# Altium schematic symbol library jlcpcb_2025_04_resistors_extended_0201.schlib: 1508 symbols (part 7 of 8)
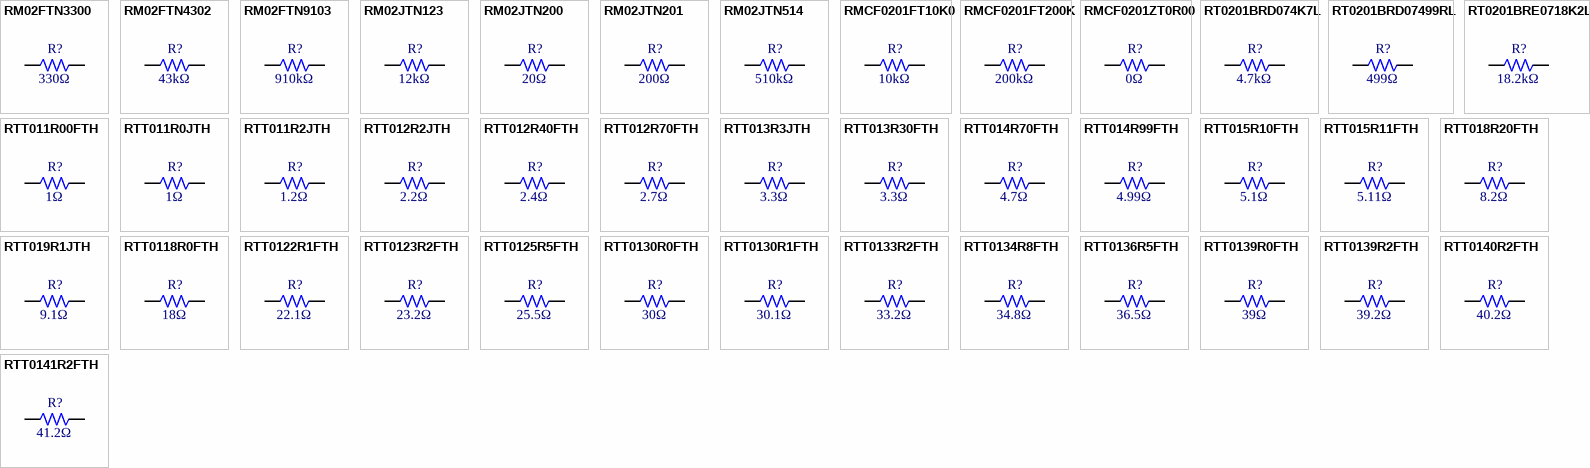
[diagram p43: symbols RM02FTN3300 to RTT0141R2FTH]

## RTT012R2JTH
designator R?  Resistance: 2.2Ω  (hidden comment: *)
Resistor, 2.2Ω, ±5%, 50mW, 25V, -200ppm/℃~+400ppm/℃, -55℃~+125℃, SMD 0201; Manufacturer: Uniroyal; Manufacturer Part Number: RTT012R2JTH; Supplier 1: LCSC; Supplier Part Number 1: C102714; JLCPCB Part Number: C102714; Power Rating: 50mW; Category: Resistors; Package Size: 0201; JLCPCB Basic Part: Yes; Tolerance: ±5%; Voltage Rating: 25V; Temperature Coefficient: -200ppm/℃~+400ppm/℃; Temperature Rating: -55℃~+125℃; ComponentLink1Description: Datasheet; ComponentLink1URL: https://wmsc.lcsc.com/wmsc/upload/file/pdf/v2/lcsc/2304140030_RALEC-RTT012R2JTH_C102714.pdf; ComponentLink2Description: JLCPCB Part URL; ComponentLink2URL: https://jlcpcb.com/partdetail/C102714
pins: 1, 2
1 alternate drawing of the same symbol

## RTT012R40FTH
designator R?  Resistance: 2.4Ω  (hidden comment: *)
Resistor, 2.4Ω, ±1%, 50mW, 25V, -200ppm/℃~+400ppm/℃, -55℃~+125℃, SMD 0201; Manufacturer: Uniroyal; Manufacturer Part Number: RTT012R40FTH; Supplier 1: LCSC; Supplier Part Number 1: C166072; JLCPCB Part Number: C166072; Power Rating: 50mW; Category: Resistors; Package Size: 0201; JLCPCB Basic Part: Yes; Tolerance: ±1%; Voltage Rating: 25V; Temperature Coefficient: -200ppm/℃~+400ppm/℃; Temperature Rating: -55℃~+125℃; ComponentLink1Description: Datasheet; ComponentLink1URL: https://wmsc.lcsc.com/wmsc/upload/file/pdf/v2/lcsc/2304140030_RALEC-RTT012R40FTH_C166072.pdf; ComponentLink2Description: JLCPCB Part URL; ComponentLink2URL: https://jlcpcb.com/partdetail/C166072
pins: 1, 2
1 alternate drawing of the same symbol

## RTT012R70FTH
designator R?  Resistance: 2.7Ω  (hidden comment: *)
Resistor, 2.7Ω, ±1%, 50mW, 25V, -200ppm/℃~+400ppm/℃, -55℃~+125℃, SMD 0201; Manufacturer: Uniroyal; Manufacturer Part Number: RTT012R70FTH; Supplier 1: LCSC; Supplier Part Number 1: C158629; JLCPCB Part Number: C158629; Power Rating: 50mW; Category: Resistors; Package Size: 0201; JLCPCB Basic Part: Yes; Tolerance: ±1%; Voltage Rating: 25V; Temperature Coefficient: -200ppm/℃~+400ppm/℃; Temperature Rating: -55℃~+125℃; ComponentLink1Description: Datasheet; ComponentLink1URL: https://wmsc.lcsc.com/wmsc/upload/file/pdf/v2/lcsc/2304140030_RALEC-RTT012R70FTH_C158629.pdf; ComponentLink2Description: JLCPCB Part URL; ComponentLink2URL: https://jlcpcb.com/partdetail/C158629
pins: 1, 2
1 alternate drawing of the same symbol

## RTT013R3JTH
designator R?  Resistance: 3.3Ω  (hidden comment: *)
Resistor, 3.3Ω, ±5%, 50mW, 25V, -200ppm/℃~+400ppm/℃, -55℃~+125℃, SMD 0201; Manufacturer: Uniroyal; Manufacturer Part Number: RTT013R3JTH; Supplier 1: LCSC; Supplier Part Number 1: C158545; JLCPCB Part Number: C158545; Power Rating: 50mW; Category: Resistors; Package Size: 0201; JLCPCB Basic Part: Yes; Tolerance: ±5%; Voltage Rating: 25V; Temperature Coefficient: -200ppm/℃~+400ppm/℃; Temperature Rating: -55℃~+125℃; ComponentLink1Description: Datasheet; ComponentLink1URL: https://wmsc.lcsc.com/wmsc/upload/file/pdf/v2/lcsc/2304140030_RALEC-RTT013R3JTH_C158545.pdf; ComponentLink2Description: JLCPCB Part URL; ComponentLink2URL: https://jlcpcb.com/partdetail/C158545
pins: 1, 2
1 alternate drawing of the same symbol

## RTT013R30FTH
designator R?  Resistance: 3.3Ω  (hidden comment: *)
Resistor, 3.3Ω, ±1%, 50mW, 25V, -200ppm/℃~+400ppm/℃, -55℃~+125℃, SMD 0201; Manufacturer: Uniroyal; Manufacturer Part Number: RTT013R30FTH; Supplier 1: LCSC; Supplier Part Number 1: C158547; JLCPCB Part Number: C158547; Power Rating: 50mW; Category: Resistors; Package Size: 0201; JLCPCB Basic Part: Yes; Tolerance: ±1%; Voltage Rating: 25V; Temperature Coefficient: -200ppm/℃~+400ppm/℃; Temperature Rating: -55℃~+125℃; ComponentLink1Description: Datasheet; ComponentLink1URL: https://wmsc.lcsc.com/wmsc/upload/file/pdf/v2/lcsc/2304140030_RALEC-RTT013R30FTH_C158547.pdf; ComponentLink2Description: JLCPCB Part URL; ComponentLink2URL: https://jlcpcb.com/partdetail/C158547
pins: 1, 2
1 alternate drawing of the same symbol

## RTT014R70FTH
designator R?  Resistance: 4.7Ω  (hidden comment: *)
Resistor, 4.7Ω, ±1%, 50mW, 25V, -200ppm/℃~+400ppm/℃, -55℃~+125℃, SMD 0201; Manufacturer: Uniroyal; Manufacturer Part Number: RTT014R70FTH; Supplier 1: LCSC; Supplier Part Number 1: C166070; JLCPCB Part Number: C166070; Power Rating: 50mW; Category: Resistors; Package Size: 0201; JLCPCB Basic Part: Yes; Tolerance: ±1%; Voltage Rating: 25V; Temperature Coefficient: -200ppm/℃~+400ppm/℃; Temperature Rating: -55℃~+125℃; ComponentLink1Description: Datasheet; ComponentLink1URL: https://wmsc.lcsc.com/wmsc/upload/file/pdf/v2/lcsc/2304140030_RALEC-RTT014R70FTH_C166070.pdf; ComponentLink2Description: JLCPCB Part URL; ComponentLink2URL: https://jlcpcb.com/partdetail/C166070
pins: 1, 2
1 alternate drawing of the same symbol

## RTT014R99FTH
designator R?  Resistance: 4.99Ω  (hidden comment: *)
Resistor, 4.99Ω, ±1%, 50mW, 25V, -200ppm/℃~+400ppm/℃, -55℃~+125℃, SMD 0201; Manufacturer: Uniroyal; Manufacturer Part Number: RTT014R99FTH; Supplier 1: LCSC; Supplier Part Number 1: C158479; JLCPCB Part Number: C158479; Power Rating: 50mW; Category: Resistors; Package Size: 0201; JLCPCB Basic Part: Yes; Tolerance: ±1%; Voltage Rating: 25V; Temperature Coefficient: -200ppm/℃~+400ppm/℃; Temperature Rating: -55℃~+125℃; ComponentLink1Description: Datasheet; ComponentLink1URL: https://wmsc.lcsc.com/wmsc/upload/file/pdf/v2/lcsc/2304140030_RALEC-RTT014R99FTH_C158479.pdf; ComponentLink2Description: JLCPCB Part URL; ComponentLink2URL: https://jlcpcb.com/partdetail/C158479
pins: 1, 2
1 alternate drawing of the same symbol

## RTT015R10FTH
designator R?  Resistance: 5.1Ω  (hidden comment: *)
Resistor, 5.1Ω, ±1%, 50mW, 25V, -200ppm/℃~+400ppm/℃, -55℃~+125℃, SMD 0201; Manufacturer: Uniroyal; Manufacturer Part Number: RTT015R10FTH; Supplier 1: LCSC; Supplier Part Number 1: C166069; JLCPCB Part Number: C166069; Power Rating: 50mW; Category: Resistors; Package Size: 0201; JLCPCB Basic Part: Yes; Tolerance: ±1%; Voltage Rating: 25V; Temperature Coefficient: -200ppm/℃~+400ppm/℃; Temperature Rating: -55℃~+125℃; ComponentLink1Description: Datasheet; ComponentLink1URL: https://wmsc.lcsc.com/wmsc/upload/file/pdf/v2/lcsc/2304140030_RALEC-RTT015R10FTH_C166069.pdf; ComponentLink2Description: JLCPCB Part URL; ComponentLink2URL: https://jlcpcb.com/partdetail/C166069
pins: 1, 2
1 alternate drawing of the same symbol

## RTT015R11FTH
designator R?  Resistance: 5.11Ω  (hidden comment: *)
Resistor, 5.11Ω, ±1%, 50mW, ±600ppm/℃, SMD 0201; Manufacturer: Uniroyal; Manufacturer Part Number: RTT015R11FTH; Supplier 1: LCSC; Supplier Part Number 1: C166068; JLCPCB Part Number: C166068; Power Rating: 50mW; Category: Resistors; Package Size: 0201; JLCPCB Basic Part: Yes; Tolerance: ±1%; Temperature Coefficient: ±600ppm/℃; ComponentLink1Description: Datasheet; ComponentLink1URL: https://wmsc.lcsc.com/wmsc/upload/file/pdf/v2/lcsc/2304140030_RALEC-RTT015R11FTH_C166068.pdf; ComponentLink2Description: JLCPCB Part URL; ComponentLink2URL: https://jlcpcb.com/partdetail/C166068
pins: 1, 2
1 alternate drawing of the same symbol

## RTT018R20FTH
designator R?  Resistance: 8.2Ω  (hidden comment: *)
Resistor, 8.2Ω, ±1%, 50mW, 25V, -200ppm/℃~+400ppm/℃, -55℃~+125℃, SMD 0201; Manufacturer: Uniroyal; Manufacturer Part Number: RTT018R20FTH; Supplier 1: LCSC; Supplier Part Number 1: C166065; JLCPCB Part Number: C166065; Power Rating: 50mW; Category: Resistors; Package Size: 0201; JLCPCB Basic Part: Yes; Tolerance: ±1%; Voltage Rating: 25V; Temperature Coefficient: -200ppm/℃~+400ppm/℃; Temperature Rating: -55℃~+125℃; ComponentLink1Description: Datasheet; ComponentLink1URL: https://wmsc.lcsc.com/wmsc/upload/file/pdf/v2/lcsc/2304140030_RALEC-RTT018R20FTH_C166065.pdf; ComponentLink2Description: JLCPCB Part URL; ComponentLink2URL: https://jlcpcb.com/partdetail/C166065
pins: 1, 2
1 alternate drawing of the same symbol

## RTT019R1JTH
designator R?  Resistance: 9.1Ω  (hidden comment: *)
Resistor, 9.1Ω, ±5%, 50mW, 25V, -200ppm/℃~+400ppm/℃, -55℃~+125℃, SMD 0201; Manufacturer: Uniroyal; Manufacturer Part Number: RTT019R1JTH; Supplier 1: LCSC; Supplier Part Number 1: C158291; JLCPCB Part Number: C158291; Power Rating: 50mW; Category: Resistors; Package Size: 0201; JLCPCB Basic Part: Yes; Tolerance: ±5%; Voltage Rating: 25V; Temperature Coefficient: -200ppm/℃~+400ppm/℃; Temperature Rating: -55℃~+125℃; ComponentLink1Description: Datasheet; ComponentLink1URL: https://wmsc.lcsc.com/wmsc/upload/file/pdf/v2/lcsc/2304140030_RALEC-RTT019R1JTH_C158291.pdf; ComponentLink2Description: JLCPCB Part URL; ComponentLink2URL: https://jlcpcb.com/partdetail/C158291
pins: 1, 2
1 alternate drawing of the same symbol

## RTT0118R0FTH
designator R?  Resistance: 18Ω  (hidden comment: *)
Resistor, 18Ω, ±1%, 50mW, 25V, ±200ppm/℃, -55℃~+125℃, SMD 0201; Manufacturer: Uniroyal; Manufacturer Part Number: RTT0118R0FTH; Supplier 1: LCSC; Supplier Part Number 1: C166312; JLCPCB Part Number: C166312; Power Rating: 50mW; Category: Resistors; Package Size: 0201; JLCPCB Basic Part: Yes; Tolerance: ±1%; Voltage Rating: 25V; Temperature Coefficient: ±200ppm/℃; Temperature Rating: -55℃~+125℃; ComponentLink1Description: Datasheet; ComponentLink1URL: https://wmsc.lcsc.com/wmsc/upload/file/pdf/v2/lcsc/2304140030_RALEC-RTT0118R0FTH_C166312.pdf; ComponentLink2Description: JLCPCB Part URL; ComponentLink2URL: https://jlcpcb.com/partdetail/C166312
pins: 1, 2
1 alternate drawing of the same symbol

## RTT0122R1FTH
designator R?  Resistance: 22.1Ω  (hidden comment: *)
Resistor, 22.1Ω, ±1%, 50mW, 25V, ±200ppm/℃, -55℃~+125℃, SMD 0201; Manufacturer: Uniroyal; Manufacturer Part Number: RTT0122R1FTH; Supplier 1: LCSC; Supplier Part Number 1: C166291; JLCPCB Part Number: C166291; Power Rating: 50mW; Category: Resistors; Package Size: 0201; JLCPCB Basic Part: Yes; Tolerance: ±1%; Voltage Rating: 25V; Temperature Coefficient: ±200ppm/℃; Temperature Rating: -55℃~+125℃; ComponentLink1Description: Datasheet; ComponentLink1URL: https://wmsc.lcsc.com/wmsc/upload/file/pdf/v2/lcsc/2304140030_RALEC-RTT0122R1FTH_C166291.pdf; ComponentLink2Description: JLCPCB Part URL; ComponentLink2URL: https://jlcpcb.com/partdetail/C166291
pins: 1, 2
1 alternate drawing of the same symbol

## RTT0123R2FTH
designator R?  Resistance: 23.2Ω  (hidden comment: *)
Resistor, 23.2Ω, ±1%, 50mW, 25V, ±200ppm/℃, -55℃~+125℃, SMD 0201; Manufacturer: Uniroyal; Manufacturer Part Number: RTT0123R2FTH; Supplier 1: LCSC; Supplier Part Number 1: C166283; JLCPCB Part Number: C166283; Power Rating: 50mW; Category: Resistors; Package Size: 0201; JLCPCB Basic Part: Yes; Tolerance: ±1%; Voltage Rating: 25V; Temperature Coefficient: ±200ppm/℃; Temperature Rating: -55℃~+125℃; ComponentLink1Description: Datasheet; ComponentLink1URL: https://wmsc.lcsc.com/wmsc/upload/file/pdf/v2/lcsc/2304140030_RALEC-RTT0123R2FTH_C166283.pdf; ComponentLink2Description: JLCPCB Part URL; ComponentLink2URL: https://jlcpcb.com/partdetail/C166283
pins: 1, 2
1 alternate drawing of the same symbol

## RTT0125R5FTH
designator R?  Resistance: 25.5Ω  (hidden comment: *)
Resistor, 25.5Ω, ±1%, 50mW, 25V, ±200ppm/℃, -55℃~+125℃, SMD 0201; Manufacturer: Uniroyal; Manufacturer Part Number: RTT0125R5FTH; Supplier 1: LCSC; Supplier Part Number 1: C166272; JLCPCB Part Number: C166272; Power Rating: 50mW; Category: Resistors; Package Size: 0201; JLCPCB Basic Part: Yes; Tolerance: ±1%; Voltage Rating: 25V; Temperature Coefficient: ±200ppm/℃; Temperature Rating: -55℃~+125℃; ComponentLink1Description: Datasheet; ComponentLink1URL: https://wmsc.lcsc.com/wmsc/upload/file/pdf/v2/lcsc/2304140030_RALEC-RTT0125R5FTH_C166272.pdf; ComponentLink2Description: JLCPCB Part URL; ComponentLink2URL: https://jlcpcb.com/partdetail/C166272
pins: 1, 2
1 alternate drawing of the same symbol

## RTT0130R0FTH
designator R?  Resistance: 30Ω  (hidden comment: *)
Resistor, 30Ω, ±1%, 50mW, 25V, ±200ppm/℃, -55℃~+125℃, SMD 0201; Manufacturer: Uniroyal; Manufacturer Part Number: RTT0130R0FTH; Supplier 1: LCSC; Supplier Part Number 1: C166248; JLCPCB Part Number: C166248; Power Rating: 50mW; Category: Resistors; Package Size: 0201; JLCPCB Basic Part: Yes; Tolerance: ±1%; Voltage Rating: 25V; Temperature Coefficient: ±200ppm/℃; Temperature Rating: -55℃~+125℃; ComponentLink1Description: Datasheet; ComponentLink1URL: https://wmsc.lcsc.com/wmsc/upload/file/pdf/v2/lcsc/2304140030_RALEC-RTT0130R0FTH_C166248.pdf; ComponentLink2Description: JLCPCB Part URL; ComponentLink2URL: https://jlcpcb.com/partdetail/C166248
pins: 1, 2
1 alternate drawing of the same symbol

## RTT0130R1FTH
designator R?  Resistance: 30.1Ω  (hidden comment: *)
Resistor, 30.1Ω, ±1%, 50mW, 25V, ±200ppm/℃, -55℃~+125℃, SMD 0201; Manufacturer: Uniroyal; Manufacturer Part Number: RTT0130R1FTH; Supplier 1: LCSC; Supplier Part Number 1: C166247; JLCPCB Part Number: C166247; Power Rating: 50mW; Category: Resistors; Package Size: 0201; JLCPCB Basic Part: Yes; Tolerance: ±1%; Voltage Rating: 25V; Temperature Coefficient: ±200ppm/℃; Temperature Rating: -55℃~+125℃; ComponentLink1Description: Datasheet; ComponentLink1URL: https://wmsc.lcsc.com/wmsc/upload/file/pdf/v2/lcsc/2304140030_RALEC-RTT0130R1FTH_C166247.pdf; ComponentLink2Description: JLCPCB Part URL; ComponentLink2URL: https://jlcpcb.com/partdetail/C166247
pins: 1, 2
1 alternate drawing of the same symbol

## RTT0133R2FTH
designator R?  Resistance: 33.2Ω  (hidden comment: *)
Resistor, 33.2Ω, ±1%, 50mW, 25V, ±200ppm/℃, -55℃~+125℃, SMD 0201; Manufacturer: Uniroyal; Manufacturer Part Number: RTT0133R2FTH; Supplier 1: LCSC; Supplier Part Number 1: C166232; JLCPCB Part Number: C166232; Power Rating: 50mW; Category: Resistors; Package Size: 0201; JLCPCB Basic Part: Yes; Tolerance: ±1%; Voltage Rating: 25V; Temperature Coefficient: ±200ppm/℃; Temperature Rating: -55℃~+125℃; ComponentLink1Description: Datasheet; ComponentLink1URL: https://wmsc.lcsc.com/wmsc/upload/file/pdf/v2/lcsc/2304140030_RALEC-RTT0133R2FTH_C166232.pdf; ComponentLink2Description: JLCPCB Part URL; ComponentLink2URL: https://jlcpcb.com/partdetail/C166232
pins: 1, 2
1 alternate drawing of the same symbol

## RTT0134R8FTH
designator R?  Resistance: 34.8Ω  (hidden comment: *)
Resistor, 34.8Ω, ±1%, 50mW, 25V, ±200ppm/℃, -55℃~+125℃, SMD 0201; Manufacturer: Uniroyal; Manufacturer Part Number: RTT0134R8FTH; Supplier 1: LCSC; Supplier Part Number 1: C166225; JLCPCB Part Number: C166225; Power Rating: 50mW; Category: Resistors; Package Size: 0201; JLCPCB Basic Part: Yes; Tolerance: ±1%; Voltage Rating: 25V; Temperature Coefficient: ±200ppm/℃; Temperature Rating: -55℃~+125℃; ComponentLink1Description: Datasheet; ComponentLink1URL: https://wmsc.lcsc.com/wmsc/upload/file/pdf/v2/lcsc/2304140030_RALEC-RTT0134R8FTH_C166225.pdf; ComponentLink2Description: JLCPCB Part URL; ComponentLink2URL: https://jlcpcb.com/partdetail/C166225
pins: 1, 2
1 alternate drawing of the same symbol

## RTT0136R5FTH
designator R?  Resistance: 36.5Ω  (hidden comment: *)
Resistor, 36.5Ω, ±1%, 50mW, 25V, ±200ppm/℃, -55℃~+125℃, SMD 0201; Manufacturer: Uniroyal; Manufacturer Part Number: RTT0136R5FTH; Supplier 1: LCSC; Supplier Part Number 1: C166217; JLCPCB Part Number: C166217; Power Rating: 50mW; Category: Resistors; Package Size: 0201; JLCPCB Basic Part: Yes; Tolerance: ±1%; Voltage Rating: 25V; Temperature Coefficient: ±200ppm/℃; Temperature Rating: -55℃~+125℃; ComponentLink1Description: Datasheet; ComponentLink1URL: https://wmsc.lcsc.com/wmsc/upload/file/pdf/v2/lcsc/2304140030_RALEC-RTT0136R5FTH_C166217.pdf; ComponentLink2Description: JLCPCB Part URL; ComponentLink2URL: https://jlcpcb.com/partdetail/C166217
pins: 1, 2
1 alternate drawing of the same symbol

## RTT0139R0FTH
designator R?  Resistance: 39Ω  (hidden comment: *)
Resistor, 39Ω, ±1%, 50mW, 25V, ±200ppm/℃, -55℃~+125℃, SMD 0201; Manufacturer: Uniroyal; Manufacturer Part Number: RTT0139R0FTH; Supplier 1: LCSC; Supplier Part Number 1: C166209; JLCPCB Part Number: C166209; Power Rating: 50mW; Category: Resistors; Package Size: 0201; JLCPCB Basic Part: Yes; Tolerance: ±1%; Voltage Rating: 25V; Temperature Coefficient: ±200ppm/℃; Temperature Rating: -55℃~+125℃; ComponentLink1Description: Datasheet; ComponentLink1URL: https://wmsc.lcsc.com/wmsc/upload/file/pdf/v2/lcsc/2304140030_RALEC-RTT0139R0FTH_C166209.pdf; ComponentLink2Description: JLCPCB Part URL; ComponentLink2URL: https://jlcpcb.com/partdetail/C166209
pins: 1, 2
1 alternate drawing of the same symbol

## RTT0139R2FTH
designator R?  Resistance: 39.2Ω  (hidden comment: *)
Resistor, 39.2Ω, ±1%, 50mW, 25V, ±200ppm/℃, -55℃~+125℃, SMD 0201; Manufacturer: Uniroyal; Manufacturer Part Number: RTT0139R2FTH; Supplier 1: LCSC; Supplier Part Number 1: C166208; JLCPCB Part Number: C166208; Power Rating: 50mW; Category: Resistors; Package Size: 0201; JLCPCB Basic Part: Yes; Tolerance: ±1%; Voltage Rating: 25V; Temperature Coefficient: ±200ppm/℃; Temperature Rating: -55℃~+125℃; ComponentLink1Description: Datasheet; ComponentLink1URL: https://wmsc.lcsc.com/wmsc/upload/file/pdf/v2/lcsc/2304140030_RALEC-RTT0139R2FTH_C166208.pdf; ComponentLink2Description: JLCPCB Part URL; ComponentLink2URL: https://jlcpcb.com/partdetail/C166208
pins: 1, 2
1 alternate drawing of the same symbol

## RTT0140R2FTH
designator R?  Resistance: 40.2Ω  (hidden comment: *)
Resistor, 40.2Ω, ±1%, 50mW, 25V, ±200ppm/℃, -55℃~+125℃, SMD 0201; Manufacturer: Uniroyal; Manufacturer Part Number: RTT0140R2FTH; Supplier 1: LCSC; Supplier Part Number 1: C166206; JLCPCB Part Number: C166206; Power Rating: 50mW; Category: Resistors; Package Size: 0201; JLCPCB Basic Part: Yes; Tolerance: ±1%; Voltage Rating: 25V; Temperature Coefficient: ±200ppm/℃; Temperature Rating: -55℃~+125℃; ComponentLink1Description: Datasheet; ComponentLink1URL: https://wmsc.lcsc.com/wmsc/upload/file/pdf/v2/lcsc/2304140030_RALEC-RTT0140R2FTH_C166206.pdf; ComponentLink2Description: JLCPCB Part URL; ComponentLink2URL: https://jlcpcb.com/partdetail/C166206
pins: 1, 2
1 alternate drawing of the same symbol

## RTT0141R2FTH
designator R?  Resistance: 41.2Ω  (hidden comment: *)
Resistor, 41.2Ω, ±1%, 50mW, 25V, ±200ppm/℃, -55℃~+125℃, SMD 0201; Manufacturer: Uniroyal; Manufacturer Part Number: RTT0141R2FTH; Supplier 1: LCSC; Supplier Part Number 1: C166203; JLCPCB Part Number: C166203; Power Rating: 50mW; Category: Resistors; Package Size: 0201; JLCPCB Basic Part: Yes; Tolerance: ±1%; Voltage Rating: 25V; Temperature Coefficient: ±200ppm/℃; Temperature Rating: -55℃~+125℃; ComponentLink1Description: Datasheet; ComponentLink1URL: https://wmsc.lcsc.com/wmsc/upload/file/pdf/v2/lcsc/2304140030_RALEC-RTT0141R2FTH_C166203.pdf; ComponentLink2Description: JLCPCB Part URL; ComponentLink2URL: https://jlcpcb.com/partdetail/C166203
pins: 1, 2
1 alternate drawing of the same symbol

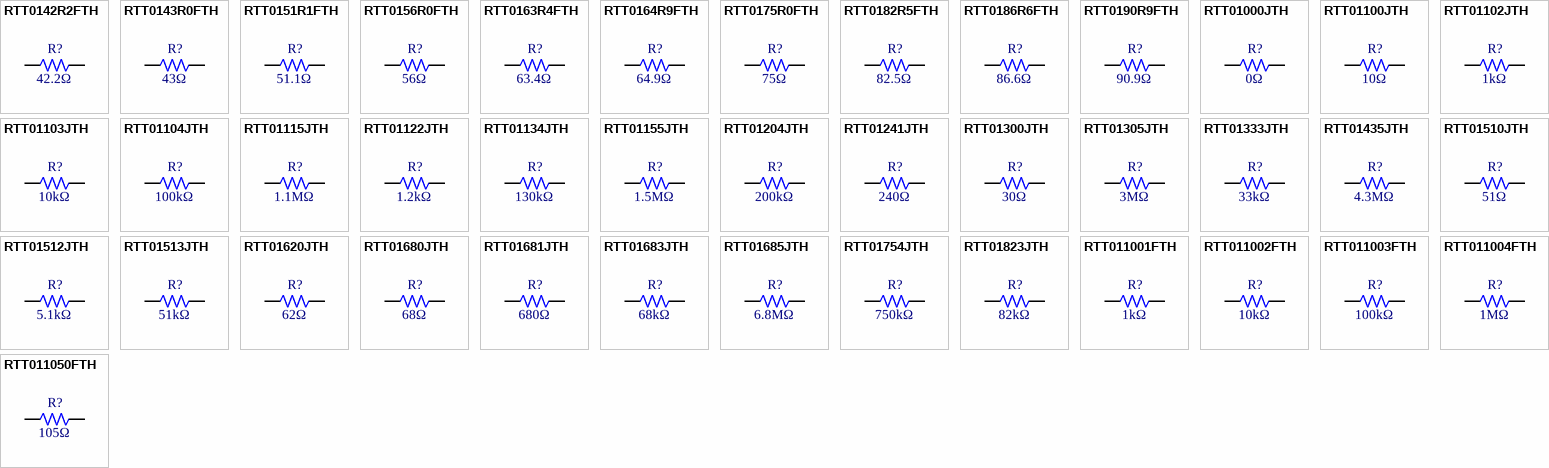
[diagram p30: symbols RTT0142R2FTH to RTT011050FTH]

## RTT0142R2FTH
designator R?  Resistance: 42.2Ω  (hidden comment: *)
Resistor, 42.2Ω, ±1%, 50mW, 25V, ±200ppm/℃, -55℃~+125℃, SMD 0201; Manufacturer: Uniroyal; Manufacturer Part Number: RTT0142R2FTH; Supplier 1: LCSC; Supplier Part Number 1: C166198; JLCPCB Part Number: C166198; Power Rating: 50mW; Category: Resistors; Package Size: 0201; JLCPCB Basic Part: Yes; Tolerance: ±1%; Voltage Rating: 25V; Temperature Coefficient: ±200ppm/℃; Temperature Rating: -55℃~+125℃; ComponentLink1Description: Datasheet; ComponentLink1URL: https://wmsc.lcsc.com/wmsc/upload/file/pdf/v2/lcsc/2304140030_RALEC-RTT0142R2FTH_C166198.pdf; ComponentLink2Description: JLCPCB Part URL; ComponentLink2URL: https://jlcpcb.com/partdetail/C166198
pins: 1, 2
1 alternate drawing of the same symbol

## RTT0143R0FTH
designator R?  Resistance: 43Ω  (hidden comment: *)
Resistor, 43Ω, ±1%, 50mW, ±200ppm/℃, SMD 0201; Manufacturer: Uniroyal; Manufacturer Part Number: RTT0143R0FTH; Supplier 1: LCSC; Supplier Part Number 1: C166193; JLCPCB Part Number: C166193; Power Rating: 50mW; Category: Resistors; Package Size: 0201; JLCPCB Basic Part: Yes; Tolerance: ±1%; Temperature Coefficient: ±200ppm/℃; ComponentLink1Description: Datasheet; ComponentLink1URL: https://wmsc.lcsc.com/wmsc/upload/file/pdf/v2/lcsc/2304140030_RALEC-RTT0143R0FTH_C166193.pdf; ComponentLink2Description: JLCPCB Part URL; ComponentLink2URL: https://jlcpcb.com/partdetail/C166193
pins: 1, 2
1 alternate drawing of the same symbol

## RTT0151R1FTH
designator R?  Resistance: 51.1Ω  (hidden comment: *)
Resistor, 51.1Ω, ±1%, 50mW, 25V, ±200ppm/℃, -55℃~+125℃, SMD 0201; Manufacturer: Uniroyal; Manufacturer Part Number: RTT0151R1FTH; Supplier 1: LCSC; Supplier Part Number 1: C166165; JLCPCB Part Number: C166165; Power Rating: 50mW; Category: Resistors; Package Size: 0201; JLCPCB Basic Part: Yes; Tolerance: ±1%; Voltage Rating: 25V; Temperature Coefficient: ±200ppm/℃; Temperature Rating: -55℃~+125℃; ComponentLink1Description: Datasheet; ComponentLink1URL: https://wmsc.lcsc.com/wmsc/upload/file/pdf/v2/lcsc/2304140030_RALEC-RTT0151R1FTH_C166165.pdf; ComponentLink2Description: JLCPCB Part URL; ComponentLink2URL: https://jlcpcb.com/partdetail/C166165
pins: 1, 2
1 alternate drawing of the same symbol

## RTT0156R0FTH
designator R?  Resistance: 56Ω  (hidden comment: *)
Resistor, 56Ω, ±1%, 50mW, 25V, ±200ppm/℃, -55℃~+125℃, SMD 0201; Manufacturer: Uniroyal; Manufacturer Part Number: RTT0156R0FTH; Supplier 1: LCSC; Supplier Part Number 1: C166149; JLCPCB Part Number: C166149; Power Rating: 50mW; Category: Resistors; Package Size: 0201; JLCPCB Basic Part: Yes; Tolerance: ±1%; Voltage Rating: 25V; Temperature Coefficient: ±200ppm/℃; Temperature Rating: -55℃~+125℃; ComponentLink1Description: Datasheet; ComponentLink1URL: https://wmsc.lcsc.com/wmsc/upload/file/pdf/v2/lcsc/2304140030_RALEC-RTT0156R0FTH_C166149.pdf; ComponentLink2Description: JLCPCB Part URL; ComponentLink2URL: https://jlcpcb.com/partdetail/C166149
pins: 1, 2
1 alternate drawing of the same symbol

## RTT0163R4FTH
designator R?  Resistance: 63.4Ω  (hidden comment: *)
Resistor, 63.4Ω, ±1%, 50mW, ±200ppm/℃, SMD 0201; Manufacturer: Uniroyal; Manufacturer Part Number: RTT0163R4FTH; Supplier 1: LCSC; Supplier Part Number 1: C166134; JLCPCB Part Number: C166134; Power Rating: 50mW; Category: Resistors; Package Size: 0201; JLCPCB Basic Part: Yes; Tolerance: ±1%; Temperature Coefficient: ±200ppm/℃; ComponentLink1Description: Datasheet; ComponentLink1URL: https://wmsc.lcsc.com/wmsc/upload/file/pdf/v2/lcsc/2304140030_RALEC-RTT0163R4FTH_C166134.pdf; ComponentLink2Description: JLCPCB Part URL; ComponentLink2URL: https://jlcpcb.com/partdetail/C166134
pins: 1, 2
1 alternate drawing of the same symbol

## RTT0164R9FTH
designator R?  Resistance: 64.9Ω  (hidden comment: *)
Resistor, 64.9Ω, ±1%, 50mW, 25V, ±200ppm/℃, -55℃~+125℃, SMD 0201; Manufacturer: Uniroyal; Manufacturer Part Number: RTT0164R9FTH; Supplier 1: LCSC; Supplier Part Number 1: C166131; JLCPCB Part Number: C166131; Power Rating: 50mW; Category: Resistors; Package Size: 0201; JLCPCB Basic Part: Yes; Tolerance: ±1%; Voltage Rating: 25V; Temperature Coefficient: ±200ppm/℃; Temperature Rating: -55℃~+125℃; ComponentLink1Description: Datasheet; ComponentLink1URL: https://wmsc.lcsc.com/wmsc/upload/file/pdf/v2/lcsc/2304140030_RALEC-RTT0164R9FTH_C166131.pdf; ComponentLink2Description: JLCPCB Part URL; ComponentLink2URL: https://jlcpcb.com/partdetail/C166131
pins: 1, 2
1 alternate drawing of the same symbol

## RTT0175R0FTH
designator R?  Resistance: 75Ω  (hidden comment: *)
Resistor, 75Ω, ±1%, 50mW, ±200ppm/℃, SMD 0201; Manufacturer: Uniroyal; Manufacturer Part Number: RTT0175R0FTH; Supplier 1: LCSC; Supplier Part Number 1: C158348; JLCPCB Part Number: C158348; Power Rating: 50mW; Category: Resistors; Package Size: 0201; JLCPCB Basic Part: Yes; Tolerance: ±1%; Temperature Coefficient: ±200ppm/℃; ComponentLink1Description: Datasheet; ComponentLink1URL: https://wmsc.lcsc.com/wmsc/upload/file/pdf/v2/lcsc/2304140030_RALEC-RTT0175R0FTH_C158348.pdf; ComponentLink2Description: JLCPCB Part URL; ComponentLink2URL: https://jlcpcb.com/partdetail/C158348
pins: 1, 2
1 alternate drawing of the same symbol

## RTT0182R5FTH
designator R?  Resistance: 82.5Ω  (hidden comment: *)
Resistor, 82.5Ω, ±1%, 50mW, 25V, ±200ppm/℃, -55℃~+125℃, SMD 0201; Manufacturer: Uniroyal; Manufacturer Part Number: RTT0182R5FTH; Supplier 1: LCSC; Supplier Part Number 1: C166099; JLCPCB Part Number: C166099; Power Rating: 50mW; Category: Resistors; Package Size: 0201; JLCPCB Basic Part: Yes; Tolerance: ±1%; Voltage Rating: 25V; Temperature Coefficient: ±200ppm/℃; Temperature Rating: -55℃~+125℃; ComponentLink1Description: Datasheet; ComponentLink1URL: https://wmsc.lcsc.com/wmsc/upload/file/pdf/v2/lcsc/2304140030_RALEC-RTT0182R5FTH_C166099.pdf; ComponentLink2Description: JLCPCB Part URL; ComponentLink2URL: https://jlcpcb.com/partdetail/C166099
pins: 1, 2
1 alternate drawing of the same symbol

## RTT0186R6FTH
designator R?  Resistance: 86.6Ω  (hidden comment: *)
Resistor, 86.6Ω, ±1%, 50mW, 25V, ±200ppm/℃, -55℃~+125℃, SMD 0201; Manufacturer: Uniroyal; Manufacturer Part Number: RTT0186R6FTH; Supplier 1: LCSC; Supplier Part Number 1: C166092; JLCPCB Part Number: C166092; Power Rating: 50mW; Category: Resistors; Package Size: 0201; JLCPCB Basic Part: Yes; Tolerance: ±1%; Voltage Rating: 25V; Temperature Coefficient: ±200ppm/℃; Temperature Rating: -55℃~+125℃; ComponentLink1Description: Datasheet; ComponentLink1URL: https://wmsc.lcsc.com/wmsc/upload/file/pdf/v2/lcsc/2304140030_RALEC-RTT0186R6FTH_C166092.pdf; ComponentLink2Description: JLCPCB Part URL; ComponentLink2URL: https://jlcpcb.com/partdetail/C166092
pins: 1, 2
1 alternate drawing of the same symbol

## RTT0190R9FTH
designator R?  Resistance: 90.9Ω  (hidden comment: *)
Resistor, 90.9Ω, ±1%, 50mW, 25V, ±200ppm/℃, -55℃~+125℃, SMD 0201; Manufacturer: Uniroyal; Manufacturer Part Number: RTT0190R9FTH; Supplier 1: LCSC; Supplier Part Number 1: C158313; JLCPCB Part Number: C158313; Power Rating: 50mW; Category: Resistors; Package Size: 0201; JLCPCB Basic Part: Yes; Tolerance: ±1%; Voltage Rating: 25V; Temperature Coefficient: ±200ppm/℃; Temperature Rating: -55℃~+125℃; ComponentLink1Description: Datasheet; ComponentLink1URL: https://wmsc.lcsc.com/wmsc/upload/file/pdf/v2/lcsc/2304140030_RALEC-RTT0190R9FTH_C158313.pdf; ComponentLink2Description: JLCPCB Part URL; ComponentLink2URL: https://jlcpcb.com/partdetail/C158313
pins: 1, 2
1 alternate drawing of the same symbol

## RTT01000JTH
designator R?  Resistance: 0Ω  (hidden comment: *)
Resistor, 0Ω, ±5%, 50mW, 25V, -55℃~+125℃, SMD 0201; Manufacturer: Uniroyal; Manufacturer Part Number: RTT01000JTH; Supplier 1: LCSC; Supplier Part Number 1: C329414; JLCPCB Part Number: C329414; Power Rating: 50mW; Category: Resistors; Package Size: 0201; JLCPCB Basic Part: Yes; Tolerance: ±5%; Voltage Rating: 25V; Temperature Rating: -55℃~+125℃; ComponentLink1Description: Datasheet; ComponentLink1URL: https://wmsc.lcsc.com/wmsc/upload/file/pdf/v2/lcsc/2304140030_RALEC-RTT01000JTH_C329414.pdf; ComponentLink2Description: JLCPCB Part URL; ComponentLink2URL: https://jlcpcb.com/partdetail/C329414
pins: 1, 2
1 alternate drawing of the same symbol

## RTT01100JTH
designator R?  Resistance: 10Ω  (hidden comment: *)
Resistor, 10Ω, ±5%, 50mW, 25V, ±200ppm/℃, -55℃~+125℃, SMD 0201; Manufacturer: Uniroyal; Manufacturer Part Number: RTT01100JTH; Supplier 1: LCSC; Supplier Part Number 1: C102687; JLCPCB Part Number: C102687; Power Rating: 50mW; Category: Resistors; Package Size: 0201; JLCPCB Basic Part: Yes; Tolerance: ±5%; Voltage Rating: 25V; Temperature Coefficient: ±200ppm/℃; Temperature Rating: -55℃~+125℃; ComponentLink1Description: Datasheet; ComponentLink1URL: https://wmsc.lcsc.com/wmsc/upload/file/pdf/v2/lcsc/2304140030_RALEC-RTT01100JTH_C102687.pdf; ComponentLink2Description: JLCPCB Part URL; ComponentLink2URL: https://jlcpcb.com/partdetail/C102687
pins: 1, 2
1 alternate drawing of the same symbol

## RTT01102JTH
designator R?  Resistance: 1kΩ  (hidden comment: *)
Resistor, 1kΩ, ±5%, 50mW, 25V, ±200ppm/℃, -55℃~+125℃, SMD 0201; Manufacturer: Uniroyal; Manufacturer Part Number: RTT01102JTH; Supplier 1: LCSC; Supplier Part Number 1: C102689; JLCPCB Part Number: C102689; Power Rating: 50mW; Category: Resistors; Package Size: 0201; JLCPCB Basic Part: Yes; Tolerance: ±5%; Voltage Rating: 25V; Temperature Coefficient: ±200ppm/℃; Temperature Rating: -55℃~+125℃; ComponentLink1Description: Datasheet; ComponentLink1URL: https://wmsc.lcsc.com/wmsc/upload/file/pdf/v2/lcsc/2304140030_RALEC-RTT01102JTH_C102689.pdf; ComponentLink2Description: JLCPCB Part URL; ComponentLink2URL: https://jlcpcb.com/partdetail/C102689
pins: 1, 2
1 alternate drawing of the same symbol

## RTT01103JTH
designator R?  Resistance: 10kΩ  (hidden comment: *)
Resistor, 10kΩ, ±5%, 50mW, 25V, ±200ppm/℃, -55℃~+125℃, SMD 0201; Manufacturer: Uniroyal; Manufacturer Part Number: RTT01103JTH; Supplier 1: LCSC; Supplier Part Number 1: C102690; JLCPCB Part Number: C102690; Power Rating: 50mW; Category: Resistors; Package Size: 0201; JLCPCB Basic Part: Yes; Tolerance: ±5%; Voltage Rating: 25V; Temperature Coefficient: ±200ppm/℃; Temperature Rating: -55℃~+125℃; ComponentLink1Description: Datasheet; ComponentLink1URL: https://wmsc.lcsc.com/wmsc/upload/file/pdf/v2/lcsc/2304140030_RALEC-RTT01103JTH_C102690.pdf; ComponentLink2Description: JLCPCB Part URL; ComponentLink2URL: https://jlcpcb.com/partdetail/C102690
pins: 1, 2
1 alternate drawing of the same symbol

## RTT01104JTH
designator R?  Resistance: 100kΩ  (hidden comment: *)
Resistor, 100kΩ, ±5%, 50mW, 25V, ±200ppm/℃, -55℃~+125℃, SMD 0201; Manufacturer: Uniroyal; Manufacturer Part Number: RTT01104JTH; Supplier 1: LCSC; Supplier Part Number 1: C105900; JLCPCB Part Number: C105900; Power Rating: 50mW; Category: Resistors; Package Size: 0201; JLCPCB Basic Part: Yes; Tolerance: ±5%; Voltage Rating: 25V; Temperature Coefficient: ±200ppm/℃; Temperature Rating: -55℃~+125℃; ComponentLink1Description: Datasheet; ComponentLink1URL: https://wmsc.lcsc.com/wmsc/upload/file/pdf/v2/lcsc/1811101110_RALEC-RTT01104JTH_C105900.pdf; ComponentLink2Description: JLCPCB Part URL; ComponentLink2URL: https://jlcpcb.com/partdetail/C105900
pins: 1, 2
1 alternate drawing of the same symbol

## RTT01115JTH
designator R?  Resistance: 1.1MΩ  (hidden comment: *)
Resistor, 1.1MΩ, ±5%, 50mW, 25V, ±200ppm/℃, -55℃~+125℃, SMD 0201; Manufacturer: Uniroyal; Manufacturer Part Number: RTT01115JTH; Supplier 1: LCSC; Supplier Part Number 1: C166419; JLCPCB Part Number: C166419; Power Rating: 50mW; Category: Resistors; Package Size: 0201; JLCPCB Basic Part: Yes; Tolerance: ±5%; Voltage Rating: 25V; Temperature Coefficient: ±200ppm/℃; Temperature Rating: -55℃~+125℃; ComponentLink1Description: Datasheet; ComponentLink1URL: https://wmsc.lcsc.com/wmsc/upload/file/pdf/v2/lcsc/2304140030_RALEC-RTT01115JTH_C166419.pdf; ComponentLink2Description: JLCPCB Part URL; ComponentLink2URL: https://jlcpcb.com/partdetail/C166419
pins: 1, 2
1 alternate drawing of the same symbol

## RTT01122JTH
designator R?  Resistance: 1.2kΩ  (hidden comment: *)
Resistor, 1.2kΩ, ±5%, 50mW, 25V, ±200ppm/℃, -55℃~+125℃, SMD 0201; Manufacturer: Uniroyal; Manufacturer Part Number: RTT01122JTH; Supplier 1: LCSC; Supplier Part Number 1: C158832; JLCPCB Part Number: C158832; Power Rating: 50mW; Category: Resistors; Package Size: 0201; JLCPCB Basic Part: Yes; Tolerance: ±5%; Voltage Rating: 25V; Temperature Coefficient: ±200ppm/℃; Temperature Rating: -55℃~+125℃; ComponentLink1Description: Datasheet; ComponentLink1URL: https://wmsc.lcsc.com/wmsc/upload/file/pdf/v2/lcsc/2304140030_RALEC-RTT01122JTH_C158832.pdf; ComponentLink2Description: JLCPCB Part URL; ComponentLink2URL: https://jlcpcb.com/partdetail/C158832
pins: 1, 2
1 alternate drawing of the same symbol

## RTT01134JTH
designator R?  Resistance: 130kΩ  (hidden comment: *)
Resistor, 130kΩ, ±5%, 50mW, 25V, ±200ppm/℃, -55℃~+125℃, SMD 0201; Manufacturer: Uniroyal; Manufacturer Part Number: RTT01134JTH; Supplier 1: LCSC; Supplier Part Number 1: C158811; JLCPCB Part Number: C158811; Power Rating: 50mW; Category: Resistors; Package Size: 0201; JLCPCB Basic Part: Yes; Tolerance: ±5%; Voltage Rating: 25V; Temperature Coefficient: ±200ppm/℃; Temperature Rating: -55℃~+125℃; ComponentLink1Description: Datasheet; ComponentLink1URL: https://wmsc.lcsc.com/wmsc/upload/file/pdf/v2/lcsc/2304140030_RALEC-RTT01134JTH_C158811.pdf; ComponentLink2Description: JLCPCB Part URL; ComponentLink2URL: https://jlcpcb.com/partdetail/C158811
pins: 1, 2
1 alternate drawing of the same symbol

## RTT01155JTH
designator R?  Resistance: 1.5MΩ  (hidden comment: *)
Resistor, 1.5MΩ, ±5%, 50mW, 25V, ±200ppm/℃, -55℃~+125℃, SMD 0201; Manufacturer: Uniroyal; Manufacturer Part Number: RTT01155JTH; Supplier 1: LCSC; Supplier Part Number 1: C158747; JLCPCB Part Number: C158747; Power Rating: 50mW; Category: Resistors; Package Size: 0201; JLCPCB Basic Part: Yes; Tolerance: ±5%; Voltage Rating: 25V; Temperature Coefficient: ±200ppm/℃; Temperature Rating: -55℃~+125℃; ComponentLink1Description: Datasheet; ComponentLink2Description: JLCPCB Part URL; ComponentLink2URL: https://jlcpcb.com/partdetail/C158747
pins: 1, 2
1 alternate drawing of the same symbol

## RTT01204JTH
designator R?  Resistance: 200kΩ  (hidden comment: *)
Resistor, 200kΩ, ±5%, 50mW, 25V, ±200ppm/℃, -55℃~+125℃, SMD 0201; Manufacturer: Uniroyal; Manufacturer Part Number: RTT01204JTH; Supplier 1: LCSC; Supplier Part Number 1: C102705; JLCPCB Part Number: C102705; Power Rating: 50mW; Category: Resistors; Package Size: 0201; JLCPCB Basic Part: Yes; Tolerance: ±5%; Voltage Rating: 25V; Temperature Coefficient: ±200ppm/℃; Temperature Rating: -55℃~+125℃; ComponentLink1Description: Datasheet; ComponentLink1URL: https://wmsc.lcsc.com/wmsc/upload/file/pdf/v2/lcsc/2304140030_RALEC-RTT01204JTH_C102705.pdf; ComponentLink2Description: JLCPCB Part URL; ComponentLink2URL: https://jlcpcb.com/partdetail/C102705
pins: 1, 2
1 alternate drawing of the same symbol

## RTT01241JTH
designator R?  Resistance: 240Ω  (hidden comment: *)
Resistor, 240Ω, ±5%, 50mW, 25V, ±200ppm/℃, -55℃~+125℃, SMD 0201; Manufacturer: Uniroyal; Manufacturer Part Number: RTT01241JTH; Supplier 1: LCSC; Supplier Part Number 1: C102710; JLCPCB Part Number: C102710; Power Rating: 50mW; Category: Resistors; Package Size: 0201; JLCPCB Basic Part: Yes; Tolerance: ±5%; Voltage Rating: 25V; Temperature Coefficient: ±200ppm/℃; Temperature Rating: -55℃~+125℃; ComponentLink1Description: Datasheet; ComponentLink1URL: https://wmsc.lcsc.com/wmsc/upload/file/pdf/v2/lcsc/2304140030_RALEC-RTT01241JTH_C102710.pdf; ComponentLink2Description: JLCPCB Part URL; ComponentLink2URL: https://jlcpcb.com/partdetail/C102710
pins: 1, 2
1 alternate drawing of the same symbol

## RTT01300JTH
designator R?  Resistance: 30Ω  (hidden comment: *)
Resistor, 30Ω, ±5%, 50mW, 25V, ±200ppm/℃, -55℃~+125℃, SMD 0201; Manufacturer: Uniroyal; Manufacturer Part Number: RTT01300JTH; Supplier 1: LCSC; Supplier Part Number 1: C102715; JLCPCB Part Number: C102715; Power Rating: 50mW; Category: Resistors; Package Size: 0201; JLCPCB Basic Part: Yes; Tolerance: ±5%; Voltage Rating: 25V; Temperature Coefficient: ±200ppm/℃; Temperature Rating: -55℃~+125℃; ComponentLink1Description: Datasheet; ComponentLink1URL: https://wmsc.lcsc.com/wmsc/upload/file/pdf/v2/lcsc/2304140030_RALEC-RTT01300JTH_C102715.pdf; ComponentLink2Description: JLCPCB Part URL; ComponentLink2URL: https://jlcpcb.com/partdetail/C102715
pins: 1, 2
1 alternate drawing of the same symbol

## RTT01305JTH
designator R?  Resistance: 3MΩ  (hidden comment: *)
Resistor, 3MΩ, ±5%, 50mW, 25V, ±200ppm/℃, -55℃~+125℃, SMD 0201; Manufacturer: Uniroyal; Manufacturer Part Number: RTT01305JTH; Supplier 1: LCSC; Supplier Part Number 1: C158614; JLCPCB Part Number: C158614; Power Rating: 50mW; Category: Resistors; Package Size: 0201; JLCPCB Basic Part: Yes; Tolerance: ±5%; Voltage Rating: 25V; Temperature Coefficient: ±200ppm/℃; Temperature Rating: -55℃~+125℃; ComponentLink1Description: Datasheet; ComponentLink1URL: https://wmsc.lcsc.com/wmsc/upload/file/pdf/v2/lcsc/2304140030_RALEC-RTT01305JTH_C158614.pdf; ComponentLink2Description: JLCPCB Part URL; ComponentLink2URL: https://jlcpcb.com/partdetail/C158614
pins: 1, 2
1 alternate drawing of the same symbol

## RTT01333JTH
designator R?  Resistance: 33kΩ  (hidden comment: *)
Resistor, 33kΩ, ±5%, 50mW, 25V, ±200ppm/℃, -55℃~+125℃, SMD 0201; Manufacturer: Uniroyal; Manufacturer Part Number: RTT01333JTH; Supplier 1: LCSC; Supplier Part Number 1: C158604; JLCPCB Part Number: C158604; Power Rating: 50mW; Category: Resistors; Package Size: 0201; JLCPCB Basic Part: Yes; Tolerance: ±5%; Voltage Rating: 25V; Temperature Coefficient: ±200ppm/℃; Temperature Rating: -55℃~+125℃; ComponentLink1Description: Datasheet; ComponentLink1URL: https://wmsc.lcsc.com/wmsc/upload/file/pdf/v2/lcsc/2304140030_RALEC-RTT01333JTH_C158604.pdf; ComponentLink2Description: JLCPCB Part URL; ComponentLink2URL: https://jlcpcb.com/partdetail/C158604
pins: 1, 2
1 alternate drawing of the same symbol
